# Altium footprint library custom.PcbLib: 330 footprints (part 20 of 21)
Each footprint in its own frame and in the unit in brackets; x right, y up, seen from the top. Pads: shape width x height; smd on the part's side, far side on the other; paste and mask are expansions set on the pad; w line width, h text height; cw(c..) or ccw(c..) is an arc to the next point about the centre after c.
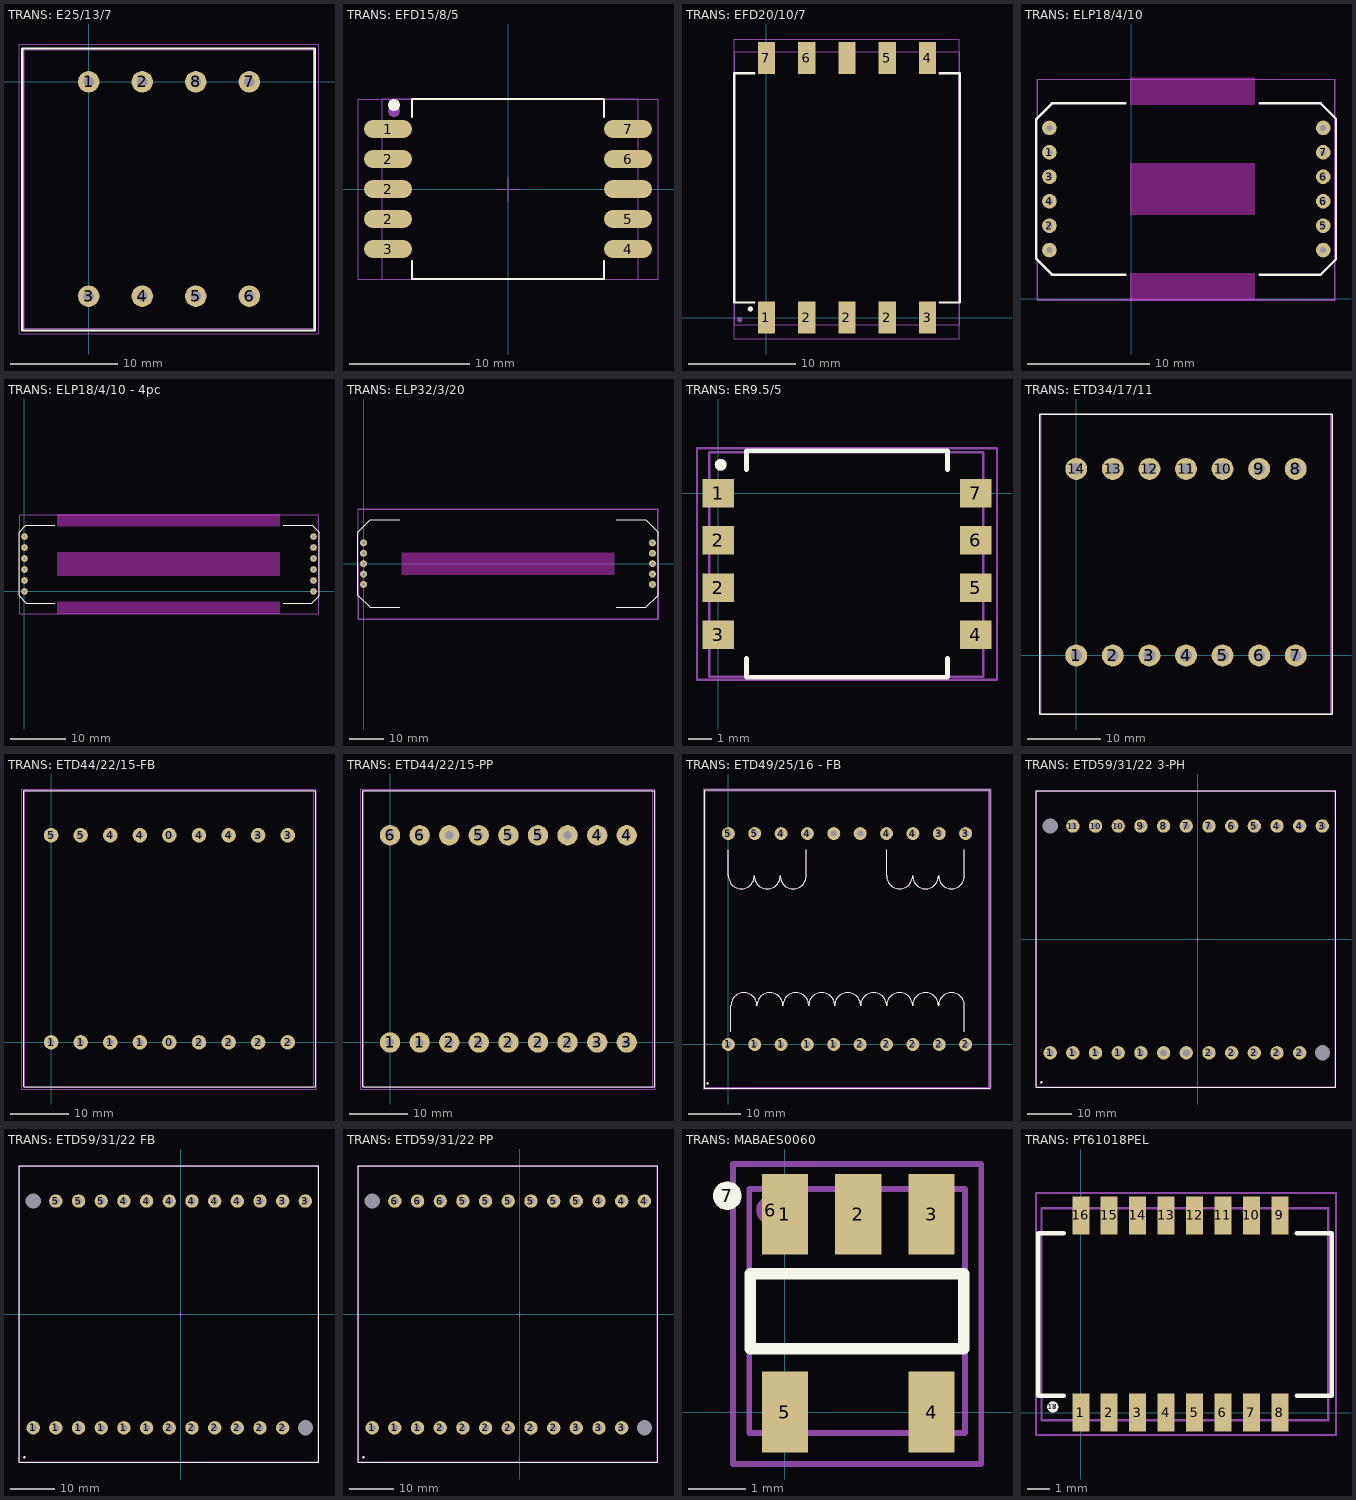
[diagram p19: the footprints below, top view; thin cyan lines are the x and y axes]

## TRANS: E25/13/7 [mm]
pads (8):
  round 2 hole 1: 1(0,0) 2(5,0) 3(0,-20) 4(5,-20) 5(10,-20) 6(15,-20) 7(15,0) 8(10,0)
Top Overlay:
  lines w0.2: -6.2,-23.2 21.1,-23.2 21.1,3.1 -6.2,3.1 -6.2,-23.2
Top Assy:
  lines w0.1: -6,-23 21,-23 21,3 -6,3 -6,-23
Size Area:
  lines w0.1: -6.5,-23.5 -6.5,3.5 21.5,3.5 21.5,-23.5 -6.5,-23.5
3D body "User Library-Choke_E25.STEP": height 21.05, standoff -2.65, extent -6,-23 21,3

## TRANS: EFD15/8/5 [mm]
pads (12):
  rrect100% 4x1.5 smd: 1(-10,5) 2(-10,-2.5) 2(-10,0) 2(-10,2.5) 3(-10,-5) 4(10,-5) 5(10,-2.5) 6(10,2.5) 7(10,5) ""(10,0)
  round 1 on Mech1: ""(-9.5,6.5)
  round 1 on Top Overlay: ""(-9.5,7)
Top Overlay:
  lines w0.2: -8,-6 -8,-7.5 8,-7.5 8,-6 ; -8,6 -8,7.5 8,7.5 8,6
Top Assy:
  lines w0.1: -10.5,-7.5 10.85,-7.5 10.85,7.5 -10.5,7.5 -10.5,-7.5
Size Area:
  lines w0.1: -1,0 1,0 ; 0,-1 0,1 ; -12.5,-7.5 -12.5,7.5 12.5,7.5 12.5,-7.5 -12.5,-7.5
3D body "EFD15.STEP": height 8.15, standoff -0.05, extent -10.5,-7.5 10.85,7.5
3D body: height 0.25, standoff 0, extent -7.5,15 -7.5,15

## TRANS: EFD20/10/7 [mm]
pads (12):
  rect 1.6x3 smd: 1(0,0) 2(3.76,0) 2(7.52,0) 2(11.28,0) 3(15.04,0) 4(15.04,24.22) 5(11.28,24.22) 6(3.76,24.22) 7(0,24.22) ""(7.52,24.22)
  round 0.5 on Mech1: ""(-2.5,-0.2)
  round 0.5 on Top Overlay: ""(-1.5,0.8)
Top Overlay:
  lines w0.2: -1.1,1.4 -3,1.4 -3,22.8 -1.1,22.8 ; 16.14,1.4 18.04,1.4 18.04,22.8 16.14,22.8
Top Assy:
  lines w0.1: -2.96,-0.685 18.04,-0.685 18.04,24.815 -2.96,24.815 -2.96,-0.685
Size Area:
  lines w0.1: -3,-2 18,-2 18,26 -3,26 -3,-2
3D body "EFD20 SMD.STEP": height 10.41, standoff 0, extent -3.06,-0.685 17.94,24.815

## TRANS: ELP18/4/10 [mm]
pads (12):
  round 1.2 hole 0.5: 1(-6.7,12) 2(-6.7,6) 3(-6.7,10) 4(-6.7,8) 5(15.7,6) 6(15.7,8) 6(15.7,10) 7(15.7,12) ""(-6.7,4) ""(-6.7,14) ""(15.7,4) ""(15.7,14)
Top Overlay:
  lines w0.2: -0.5,2 -4.3,2 -6.5,2 -7.8,3.3 -7.8,14.7 -6.5,16 -0.5,16 ; 10.5,2 13.2,2 15.5,2 16.75,3.25 16.75,14.75 15.5,16 10.5,16
Keep-Out Layer:
  board cut-out: -0.1,-0.1 10.1,-0.1 10.1,2.1 -0.1,2.1
  board cut-out: -0.1,6.9 10.1,6.9 10.1,11.1 -0.1,11.1
  board cut-out: -0.1,15.9 10.1,15.9 10.1,18.1 -0.1,18.1
Top Assy:
  lines w0.1: -7.671,-0.011 -7.671,17.994 16.629,17.994 16.629,-0.011 -7.671,-0.011
Size Area:
  lines w0.1: -7.7,-0.1 -7.7,18 16.7,18 16.7,-0.1 -7.7,-0.1
3D body "transLast.STEP": height 4.95, standoff -3.05, extent -7.707,0 16.6,18

## TRANS: ELP18/4/10 - 4pc [mm]
pads (12):
  round 1.2 hole 0.5: 1(0,8) 2(0,2) 3(0,6) 4(0,4) 5(52.6,2) 6(52.6,4) 6(52.6,6) 7(52.6,8) ""(0,0) ""(0,10) ""(52.6,0) ""(52.6,10)
Top Overlay:
  lines w0.2: 5.5,-2.1 0.3,-2.1 -1,-0.8 -1,10.8 0.25,12.05 5.5,12.05 ; 47.1,-2.1 52.3,-2.1 53.6,-0.8 53.6,10.8 52.35,12.05 47.1,12.05
Keep-Out Layer:
  board cut-out: 6,-4.1 46.5,-4.1 46.5,-1.9 6,-1.9
  board cut-out: 6,2.9 46.5,2.9 46.5,7.1 6,7.1
  board cut-out: 6,11.9 46.5,11.9 46.5,14.1 6,14.1
3D model:
  lines w0.1: -0.875,-4.025 53.525,-4.025 53.525,13.975 -0.875,13.975 -0.875,-4.025 ; -0.875,-4.025 -0.875,-4.025
Size Area:
  lines w0.1: -0.875,-4.025 53.525,-4.025 53.525,13.975 -0.875,13.975 -0.875,-4.025
3D body "Transformer 120W.STEP": height 4.95, standoff -3.05, extent -0.875,-4.025 53.525,13.975

## TRANS: ELP32/3/20 [mm]
pads (10):
  round 2 hole 1: 0(0,0) 1(0,6) 2(0,3) 3(0,-3) 4(0,-6) 5(83.5,-6) 5(83.5,-3) 6(83.5,0) 7(83.5,3) 7(83.5,6)
Top Overlay:
  lines w0.2: 10.5,-12.65 1.95,-12.65 -1.6,-9.1 -1.6,0 -1.6,9.1 1.95,12.65 10.5,12.65 ; 73,-12.65 81.55,-12.65 85.1,-9.1 85.1,0 85.1,9.1 81.55,12.65 73,12.65
Keep-Out Layer:
  board cut-out: 72.425,3.2 72.425,-3.2 11.1,-3.2 11.1,3.2
Top Assy:
  lines w0.1: -1.5,-15.975 85,-15.975 85,15.775 -1.5,15.775 -1.5,-15.975
Size Area:
  lines w0.1: -1.6,-16 -1.6,15.8 85.1,15.8 85.1,-16 -1.6,-16
3D body "Планарный трансформатор ELP32.STEP": height 7.62, standoff -5.08, extent -1.5,-15.975 85,15.775

## TRANS: ER9.5/5 [mm]
pads (10):
  rect 1.35x1.2 smd: 1(0,0) 2(0,-4) 2(0,-2) 3(0,-6) 4(10.9,-6) 5(10.9,-4) 6(10.9,-2) 7(10.9,0)
  round 0.5 on Top Overlay: ""(0.1,1.2)
  round 0.5 on Mech1: ""(0.1,1.2)
Top Overlay:
  lines w0.2: 1.2,-7 1.2,-7.8 9.7,-7.8 9.7,-7 ; 1.2,1 1.2,1.8 9.7,1.8 9.7,1
Top Assy:
  lines w0.1: -0.387,-7.77 -0.387,1.73 11.213,1.73 11.213,-7.77 -0.387,-7.77
Size Area:
  lines w0.1: -0.9,-7.9 11.8,-7.9 11.8,1.9 -0.9,1.9 -0.9,-7.9
3D body "1.STEP": height 5.2, standoff -0.05, extent -0.387,-7.77 11.213,1.73

## TRANS: ETD34/17/11 [mm]
pads (14):
  round 3 hole 1.6: 1(0,0) 2(5,0) 3(10,0) 4(15,0) 5(20,0) 6(25,0) 7(30,0) 8(30,25.5) 9(25,25.5) 10(20,25.5) 11(15,25.5) 12(10,25.5) 13(5,25.5) 14(0,25.5)
Top Overlay:
  lines w0.2: -5,-8 35,-8 35,33 -5,33 -5,-8
Top Assy:
  lines w0.1: -4.8,-8 34.8,-8 34.8,33 -4.8,33 -4.8,-8
Size Area:
  lines w0.1: -5,-8 -5,33 35,33 35,-8 -5,-8
3D body "User Library-ETD34.STEP": height 32.9, standoff -2.44, extent -4.8,-8 34.8,33

## TRANS: ETD44/22/15-FB [mm]
pads (18):
  round 2.5 hole 1.2: 0(20.32,0) 0(20.32,35.56) 1(0,0) 1(5.08,0) 1(10.16,0) 1(15.24,0) 2(25.4,0) 2(30.48,0) 2(35.56,0) 2(40.64,0) 3(35.56,35.56) 3(40.64,35.56) 4(10.16,35.56) 4(15.24,35.56) 4(25.4,35.56) 4(30.48,35.56) 5(0,35.56) 5(5.08,35.56)
Top Overlay:
  lines w0.2: -4.7,-7.62 45.4,-7.62 45.4,43.18 -4.7,43.18 -4.7,-7.62
Top Assy:
  lines w0.1: -4.48,-7.72 45.12,-7.72 45.12,43.28 -4.48,43.28 -4.48,-7.72
Size Area:
  lines w0.1: -5,-8 -5,43.5 45.5,43.5 45.5,-8 -5,-8
3D body "User Library-ETD44.STEP": height 38.1, standoff -4.5, extent -4.48,-7.72 45.12,43.28

## TRANS: ETD44/22/15-PP [mm]
pads (18):
  round 3.5 hole 1.4: 1(0,0) 1(5.08,0) 2(10.16,0) 2(15.24,0) 2(20.32,0) 2(25.4,0) 2(30.48,0) 3(35.56,0) 3(40.64,0) 4(35.56,35.56) 4(40.64,35.56) 5(15.24,35.56) 5(20.32,35.56) 5(25.4,35.56) 6(0,35.56) 6(5.08,35.56) ""(10.16,35.56) ""(30.48,35.56)
Top Overlay:
  lines w0.2: -4.7,-7.62 -4.7,43.18 45.4,43.18 45.4,-7.62 -4.7,-7.62
Top Assy:
  lines w0.1: -4.48,-7.72 -4.48,43.28 45.12,43.28 45.12,-7.72 -4.48,-7.72
Size Area:
  lines w0.1: -5,-8 45.5,-8 45.5,43.5 -5,43.5 -5,-8
3D body "User Library-ETD44.STEP": height 38.1, standoff -4.5, extent -4.48,-7.72 45.12,43.28

## TRANS: ETD49/25/16 - FB [mm]
pads (21):
  round 2.5 hole 1.2: 1(0,0) 1(5.08,0) 1(10.16,0) 1(15.24,0) 1(20.32,0) 2(25.4,0) 2(30.48,0) 2(35.56,0) 2(40.64,0) 2(45.72,0) 3(40.64,40.64) 3(45.72,40.64) 4(10.16,40.64) 4(15.24,40.64) 4(30.48,40.64) 4(35.56,40.64) 5(0,40.64) 5(5.08,40.64) ""(20.32,40.64) ""(25.4,40.64)
  round 0.5 on Top Overlay: ""(-4,-7.5)
Top Overlay:
  lines w0.2: 0,37.5 0,32.5 ccw(c2.5,32.5) 5,32.5 ccw(c7.5,32.5) 10,32.5 ccw(c12.5,32.5) 15,32.5 15,37.5 ; 0.5,2.5 0.5,7.5 cw(c3,7.5) 5.5,7.5 cw(c8,7.5) 10.5,7.5 cw(c13,7.5) 15.5,7.5 cw(c18,7.5) 20.5,7.5 cw(c23,7.5) 25.5,7.5 cw(c28,7.5) 30.5,7.5 cw(c33,7.5) 35.5,7.5 cw(c38,7.5) 40.5,7.5 cw(c43,7.5) 45.5,7.5 45.5,2.5 ; 30.5,37.5 30.5,32.5 ccw(c33,32.5) 35.5,32.5 ccw(c38,32.5) 40.5,32.5 ccw(c43,32.5) 45.5,32.5 45.5,37.5 ; -4.65,-8.425 -4.65,49.075 50.375,49.075 50.375,-8.425 -4.65,-8.425
Top Assy:
  lines w0.1: 0,37.5 0,32.5 ccw(c2.5,32.5) 5,32.5 ccw(c7.5,32.5) 10,32.5 ccw(c12.5,32.5) 15,32.5 15,37.5 ; 0.5,2.5 0.5,7.5 cw(c3,7.5) 5.5,7.5 cw(c8,7.5) 10.5,7.5 cw(c13,7.5) 15.5,7.5 cw(c18,7.5) 20.5,7.5 cw(c23,7.5) 25.5,7.5 cw(c28,7.5) 30.5,7.5 cw(c33,7.5) 35.5,7.5 cw(c38,7.5) 40.5,7.5 cw(c43,7.5) 45.5,7.5 45.5,2.5 ; 30.5,37.5 30.5,32.5 ccw(c33,32.5) 35.5,32.5 ccw(c38,32.5) 40.5,32.5 ccw(c43,32.5) 45.5,32.5 45.5,37.5 ; -4.49,-8.28 -4.49,48.92 50.21,48.92 50.21,-8.28 -4.49,-8.28
Size Area:
  lines w0.1: -4.8,-8.575 50.525,-8.575 50.525,49.225 -4.8,49.225 -4.8,-8.575
3D body "222.STEP": height 41, standoff -3.86, extent -4.49,-8.28 50.21,48.92

## TRANS: ETD59/31/22 3-PH [mm]
pads (28):
  round 0.5 on Mech1: 1(-35,-32)
  round 0.5 on Top Overlay: 1(-35,-32)
  round 3 hole 1.6: 1(-33.02,-25.4) 1(-27.94,-25.4) 1(-22.86,-25.4) 1(-17.78,-25.4) 1(-12.7,-25.4) 2(2.54,-25.4) 2(7.62,-25.4) 2(12.7,-25.4) 2(17.78,-25.4) 2(22.86,-25.4) 3(27.94,25.4) 4(17.78,25.4) 4(22.86,25.4) 5(12.7,25.4) 6(7.62,25.4) 7(-2.54,25.4) 7(2.54,25.4) 8(-7.62,25.4) 9(-12.7,25.4) 10(-22.86,25.4) 10(-17.78,25.4) 11(-27.94,25.4) ""(-7.62,-25.4) ""(-2.54,-25.4)
  round 3 hole 3.4: ""(-33.02,25.4) ""(27.94,-25.4)
Top Overlay:
  lines w0.2: -36.2,-33.1 31,-33.1 31,33.3 -36.2,33.3 -36.2,-33.1
Top Assy:
  lines w0.1: -36.04,33.146 30.86,33.146 30.86,-32.953 -36.04,-32.953 -36.04,33.107 -36,33.146
Size Area:
  lines w0.1: -0.5,0 0.5,0 ; 0,-0.5 0,0.5 ; -36.2,-33.1 31,-33.1 31,33.3 -36.2,33.3 -36.2,-33.1
3D body "ETD59-31-22.STEP": height 51.38, standoff -1.62, extent -36.039,-32.953 30.86,33.146

## TRANS: ETD59/31/22 FB [mm]
pads (28):
  round 3 hole 1.6: 1(-33.02,-25.4) 1(-27.94,-25.4) 1(-22.86,-25.4) 1(-17.78,-25.4) 1(-12.7,-25.4) 1(-7.62,-25.4) 2(-2.54,-25.4) 2(2.54,-25.4) 2(7.62,-25.4) 2(12.7,-25.4) 2(17.78,-25.4) 2(22.86,-25.4) 3(17.78,25.4) 3(22.86,25.4) 3(27.94,25.4) 4(-12.7,25.4) 4(-7.62,25.4) 4(-2.54,25.4) 4(2.54,25.4) 4(7.62,25.4) 4(12.7,25.4) 5(-27.94,25.4) 5(-22.86,25.4) 5(-17.78,25.4)
  round 0.5 on Mech1: ""(-35,-32)
  round 0.5 on Top Overlay: ""(-35,-32)
  round 3 hole 3.4: ""(-33.02,25.4) ""(27.94,-25.4)
Top Overlay:
  lines w0.2: -36.2,-33.1 -36.2,33.3 31,33.3 31,-33.1 -36.2,-33.1
Top Assy:
  lines w0.1: -36.04,33.146 30.86,33.146 30.86,-32.953 -36.04,-32.953 -36.04,33.107 -36,33.146
Size Area:
  lines w0.1: -0.5,0 0.5,0 ; 0,-0.5 0,0.5 ; -36.2,-33.1 -36.2,33.3 31,33.3 31,-33.1 -36.2,-33.1
3D body "ETD59-31-22.STEP": height 51.38, standoff -1.62, extent -36.039,-32.953 30.86,33.146

## TRANS: ETD59/31/22 PP [mm]
pads (28):
  round 3 hole 1.6: 1(-33.02,-25.4) 1(-27.94,-25.4) 1(-22.86,-25.4) 2(-17.78,-25.4) 2(-12.7,-25.4) 2(-7.62,-25.4) 2(-2.54,-25.4) 2(2.54,-25.4) 2(7.62,-25.4) 3(12.7,-25.4) 3(17.78,-25.4) 3(22.86,-25.4) 4(17.78,25.4) 4(22.86,25.4) 4(27.94,25.4) 5(-12.7,25.4) 5(-7.62,25.4) 5(-2.54,25.4) 5(2.54,25.4) 5(7.62,25.4) 5(12.7,25.4) 6(-27.94,25.4) 6(-22.86,25.4) 6(-17.78,25.4)
  round 0.5 on Mech1: ""(-35,-32)
  round 0.5 on Top Overlay: ""(-35,-32)
  round 3 hole 3.4: ""(-33.02,25.4) ""(27.94,-25.4)
Top Overlay:
  lines w0.2: -36.2,-33.1 31,-33.1 31,33.3 -36.2,33.3 -36.2,-33.1
Top Assy:
  lines w0.1: -36.04,33.146 30.86,33.146 30.86,-32.953 -36.04,-32.953 -36.04,33.107 -36,33.146
Size Area:
  lines w0.1: -0.5,0 0.5,0 ; 0,-0.5 0,0.5 ; -36.2,-33.1 31,-33.1 31,33.3 -36.2,33.3 -36.2,-33.1
3D body "ETD59-31-22.STEP": height 51.38, standoff -1.62, extent -36.039,-32.953 30.86,33.146

## TRANS: MABAES0060 [mm]
pads (7):
  rect 0.8x1.4 smd: 1(0,3.43) 2(1.27,3.43) 3(2.54,3.43) 4(2.54,0) 5(0,0)
  round 0.5 on Mech1: 6(-0.25,3.5)
  round 0.5 on Top Overlay: 7(-1,3.75)
Top Overlay:
  lines w0.2: -0.6,1.1 -0.6,2.4 3.1,2.4 3.1,1.1 -0.6,1.1
Top Assy:
  lines w0.1: -0.62,-0.365 3.12,-0.365 3.12,3.865 -0.62,3.865 -0.62,-0.365
Size Area:
  lines w0.1: -0.9,-0.9 -0.9,4.3 3.4,4.3 3.4,-0.9 -0.9,-0.9
3D body "User Library-FluxBalun.STEP": height -0.4, standoff -3.95, extent -0.62,-0.365 3.12,3.865

## TRANS: PT61018PEL [mm]
pads (18):
  rect 0.76x1.7 smd: 1(0,0) 2(1.27,0) 3(2.54,0) 4(3.81,0) 5(5.08,0) 6(6.35,0) 7(7.62,0) 8(8.89,0) 9(8.89,8.8) 10(7.62,8.8) 11(6.35,8.8) 12(5.08,8.8) 13(3.81,8.8) 14(2.54,8.8) 15(1.27,8.8) 16(0,8.8)
  round 0.5 on Mech1: 17(-1.25,0.25)
  round 0.5 on Top Overlay: 18(-1.25,0.25)
Top Overlay:
  lines w0.2: -0.75,0.75 -1.9,0.75 -1.9,8 -0.75,8 ; 9.65,0.75 11.2,0.75 11.2,8 9.65,8
Top Assy:
  lines w0.1: -1.75,-0.35 -1.75,9.128 11.05,9.128 11.05,-0.35 -1.75,-0.35
Size Area:
  lines w0.1: -2,-1 11.4,-1 11.4,9.8 -2,9.8 -2,-1
3D body "PT61018PEL.stp": height 6.01, standoff -0.04, extent -1.75,-0.35 11.05,9.128